# Altium footprint library Udemy_PCB_LIB.PcbLib: 35 footprints (part 3 of 3)
Each footprint in its own frame and in the unit in brackets; x right, y up, seen from the top. Pads: shape width x height; smd on the part's side, far side on the other; paste and mask are expansions set on the pad; w line width, h text height; cw(c..) or ccw(c..) is an arc to the next point about the centre after c.
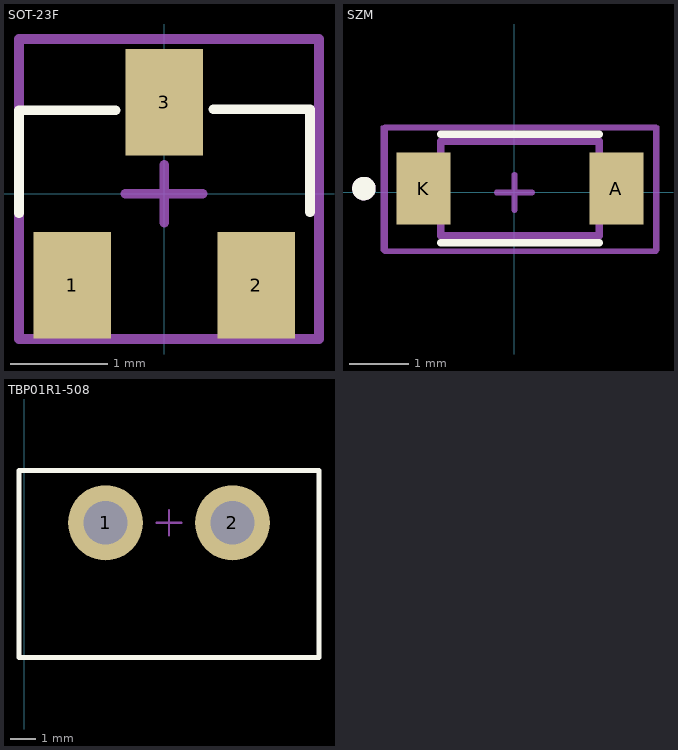
[diagram p2: the footprints below, top view; thin cyan lines are the x and y axes]

## SOT-23F [mm]
pads (3):
  rect 0.8x1.1 smd mask+0.05: 1(-0.95,-0.945) 2(0.95,-0.945) 3(0,0.945)
Top Overlay:
  lines w0.1: -1.5,-0.2 -1.5,0.864 -0.5,0.864 ; 0.507,0.875 1.507,0.875 1.507,-0.189
Top Component Center:
  lines w0.1: -0.4,0 0.4,0 ; 0,-0.3 0,0.3 ; -1.5,-1.5 -1.5,1.6 1.6,1.6 1.6,-1.5 -1.5,-1.5
Top Designator:
  lines w0.1: -1.5,-1.5 -1.5,1.6 1.6,1.6 1.6,-1.5 -1.5,-1.5
  text ".Designator" at -0.8,-0.133 h0.5
3D body "User Library-SOT23F.STEP": height 0.91, standoff 0, extent -1.45,-1.2 1.45,1.2

## SZM [mm]
pads (2):
  rect 0.915x1.22 smd mask+0.05: A(1.732,0.065) K(-1.543,0.065)
Top Overlay:
  circle w0.2: c-2.556,0.065 r0.1
  lines w0.127: -1.251,-0.858 1.439,-0.858 ; -1.251,0.989 1.439,0.989
Top Component Center:
  lines w0.1: -0.3,0 0.3,0 ; 0,-0.3 0,0.3 ; -2.2,-1 2.4,-1 2.4,1.1 -2.2,1.1 -2.2,-1
Top Designator:
  lines w0.1: -2.2,-1 2.4,-1 2.4,1.1 -2.2,1.1 -2.2,-1
  text ".Designator" at -2,-0.467 h1
Mechanical 13:
  circle w0.2: c-2.556,0.065 r0.1
  lines w0.127: -1.251,-0.735 -1.251,0.865 1.439,0.865 1.439,-0.735 -1.251,-0.735
Mechanical 15:
  lines w0.05: -2.251,-0.985 -2.251,1.115 2.439,1.115 2.439,-0.985 -2.251,-0.985
3D body "step_temp.STEP": height 1.35, standoff 0, extent -1.747,-0.735 1.936,0.865

## TBP01R1-508 [mm]
pads (2):
  round 3 hole 1.75 mask+0.05: 1(3.26,-9.3) 2(8.34,-9.3)
Top Overlay:
  lines w0.2: -0.2,-14.7 11.8,-14.7 11.8,-11.5 11.8,-7.2 -0.2,-7.2 -0.2,-14.7
Top 3D Body:
  lines w0.1: 5.3,-9.3 6.3,-9.3 ; 5.8,-9.8 5.8,-8.8 ; -0.2,-14.7 11.8,-14.7 11.8,-7.2 -0.2,-7.2 -0.2,-14.7
Bottom Designator:
  lines w0.1: -0.2,-14.7 11.8,-14.7 11.8,-7.2 -0.2,-7.2 -0.2,-14.7
  text "'.Designator'" at 2.054,-11.038 h1.52
3D body "CUI_DEVICES_TBP01R1-508-02BE.step": height 8.55, standoff -3.95, extent -0.08,-19.3 11.68,-7.3